# Altium footprint library XU-GENARAL PCB .PcbLib: 1176 footprints (part 68 of 75)
Each footprint in its own frame and in the unit in brackets; x right, y up, seen from the top. Pads: shape width x height; smd on the part's side, far side on the other; paste and mask are expansions set on the pad; w line width, h text height; cw(c..) or ccw(c..) is an arc to the next point about the centre after c.
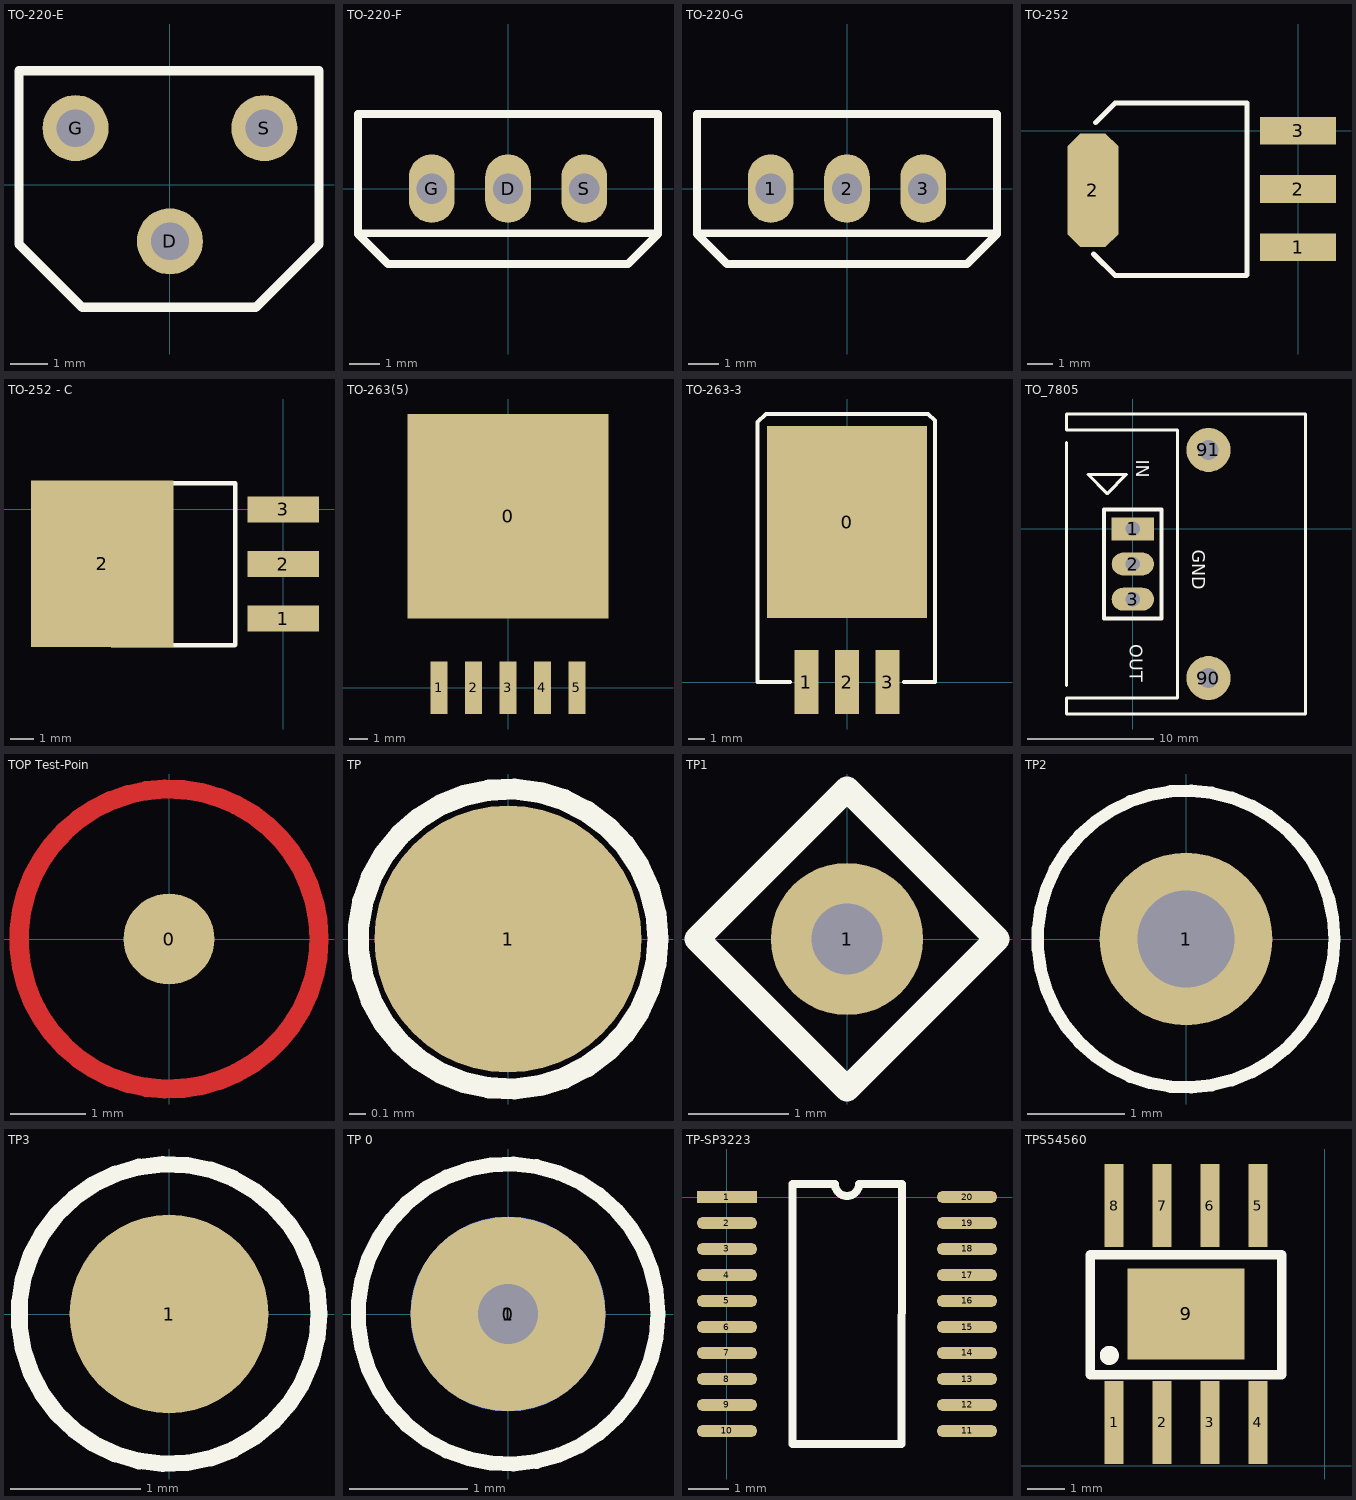
[diagram p67: the footprints below, top view; thin cyan lines are the x and y axes]

## TO-220-E [mil]
pads (3):
  round 70 hole 40: D(0,-60) G(-100,60) S(100,60)
Top Overlay:
  lines w10: -160,-63 -160,121 158,121 158,-63 91,-130 -93,-130 -160,-63

## TO-220-F [mil]
pads (3):
  oval 60x90 hole 40: D(0,0) G(-100,0) S(100,0)
Top Overlay:
  lines w10: -196.85,-58.5 196.85,-58.5 ; 129,-98.93 157.48,-98.93 196.85,-59.56 196.85,97.93 -196.85,97.93 -196.85,-59.56 -157.48,-98.93 -137.8,-98.93 137.8,-98.93

## TO-220-G [mil]
pads (3):
  oval 60x90 hole 40: 1(-100,0) 2(0,0) 3(100,0)
Top Overlay:
  lines w10: -196.85,-58.5 196.85,-58.5 ; 129,-98.93 157.48,-98.93 196.85,-59.56 196.85,97.93 -196.85,97.93 -196.85,-59.56 -157.48,-98.93 -137.8,-98.93 137.8,-98.93

## TO-252 [mm]
pads (4):
  rect 3x1.1 smd: 1(0,-4.6) 2(0,-2.3) 3(0,0)
  oct 2x4.5 smd: 2(-8.103,-2.351)
Top Overlay:
  lines w0.203: -8.077,-4.865 -7.222,-5.72 -2.042,-5.72 ; -8.001,0.321 -7.222,1.1 -2.022,1.1 -2.022,-2.3 -2.022,-5.7

## TO-252 - C [mm]
pads (4):
  rect 3x1.1 smd: 1(0,-4.6) 2(0,-2.3) 3(0,0)
  rect 6x7 smd: 2(-7.62,-2.286)
Top Overlay:
  lines w0.203: -8.077,-4.865 -7.222,-5.72 -2.042,-5.72 ; -8.001,0.321 -7.222,1.1 -2.022,1.1 -2.022,-2.3 -2.022,-5.7

## TO-263(5) [mil]
pads (6):
  rect 420x426.97 smd: 0(0,358)
  rect 35.98x110 smd: 1(-144.02,0) 2(-72.01,0) 3(0,0) 4(72.01,0) 5(144.02,0)

## TO-263-3 [mm]
height 6.8
pads (4):
  rect 10x12 smd: 0(0,10)
  rect 1.5x4 smd: 1(-2.54,0) 2(0,0) 3(2.54,0)
Top Overlay:
  lines w0.254: -5.588,0 -5.588,16.256 -5.08,16.764 5.08,16.764 5.5,16.344 5.5,14.732 ; -5.5,0 -3.556,0 ; 3.556,0 5.5,0 5.5,15.836

## TO_7805 [mil]
pads (5):
  rect 132x72 hole 45: 1(0,0)
  oval 132x72 hole 45: 2(0,-110) 3(0,-220)
  round 137.79 hole 62.99: 90(236.22,-466.3) 91(236.22,246.3)
Top Overlay:
  lines w10: -207,-488.5 -207,268.5 ; 139.13,-120 139.13,-100 139.13,308.5 -207,308.5 -207,358.5 539.13,358.5 539.13,-578.5 -207,-578.5 -207,-528.5 139.13,-528.5 139.13,-110 ; -140,170 -20,170 -80,110 -140,170
  lines w12: -90,-280 90,-280 90,60 -90,60 -90,-280
  text "IN" at 10,215 h40
  text "GND" at 185,-65 h40
  text "OUT" at -10,-360 h40

## TOP Test-Poin [mm]
pads (1):
  round 1.2 smd: 0(0,0)
Top Layer:
  circle w0.254: c0,0 r1.98

## TP [mm]
pads (1):
  round 1.6 smd: 1(0,0)
Top Overlay:
  circle w0.127: c0,0 r0.898

## TP1 [mil]
pads (1):
  round 60 hole 28: 1(0,0)
Top Overlay:
  lines w10: -59.06,0 0,59.06 59.06,0 0,-59.06 -59.06,0

## TP2 [mil]
pads (1):
  round 70 hole 39.37: 1(0,0)
Top Overlay:
  circle w5: c0,0 r60.21
Bottom Overlay:
  circle w5: c0,0 r60.83

## TP3 [mil]
pads (1):
  round 60 smd: 1(0,0)
Top Overlay:
  circle w5: c0,0 r45.28

## TP 0 [mil]
pads (2):
  round 65 on Bottom hole 20: 0(0,0)
  round 65 on Top hole 20: 1(0,0)
Top Overlay:
  circle w5: c0,0 r50

## TP-SP3223 [mm]
pads (20):
  rect 1.5x0.3 smd: 1(0,0)
  oval 1.5x0.3 smd: 2(0,-0.65) 3(0,-1.3) 4(0,-1.95) 5(0,-2.6) 6(0,-3.25) 7(0,-3.9) 8(0,-4.55) 9(0,-5.2) 10(0,-5.85) 11(6,-5.85) 12(6,-5.2) 13(6,-4.55) 14(6,-3.9) 15(6,-3.25) 16(6,-2.6) 17(6,-1.95) 18(6,-1.3) 19(6,-0.65) 20(6,0)
Top Overlay:
  lines w0.2: 2.653,0.325 1.635,0.325 1.635,-6.175 4.365,-6.175 4.375,0.325 3.303,0.325 ; 2.7,0.325 ccw(c3,0.325) 3.3,0.325

## TPS54560 [mm]
pads (9):
  rect 0.5x2.2 smd: 1(-5.588,1.143) 2(-4.318,1.143) 3(-3.048,1.143) 4(-1.778,1.143) 5(-1.778,6.893) 6(-3.048,6.893) 7(-4.318,6.893) 8(-5.588,6.893)
  rect 3.1x2.4 smd: 9(-3.683,4.018)
Top Overlay:
  circle w0.254: c-5.715,2.921 r0.127
  lines w0.254: -6.223,2.413 -1.143,2.413 -1.143,5.588 -6.223,5.588 -6.223,2.413